# Altium schematic symbol library jlcpcb_2025_04_inductors_extended_0805.schlib: 882 symbols (part 4 of 5) (continued)
## SCHF201209H3N9ST
designator L?  Inductance: 3.9nH
Inductor, 3.9nH, 150mΩ, 600mA, SMD 0805; Manufacturer: Yanchuang; Manufacturer Part Number: SCHF201209H3N9ST; Package Size: 0805; JLCPCB Basic Part: No; JLCPCB Part Number: C578020; Supplier 1: LCSC; Category: Inductors; Supplier Part Number 1: C578020; Rated Current: 600mA; DC Resistance: 150mΩ; RoHS: Yes; ComponentLink1Description: Datasheet; ComponentLink1URL: https://wmsc.lcsc.com/wmsc/upload/file/pdf/v2/lcsc/2304140030_Yanchuang-SCHF201209H3N9ST_C578020.pdf; ComponentLink2Description: JLCPCB Part URL; ComponentLink2URL: https://jlcpcb.com/partdetail/C578020; ComponentLink3Description: LCSC Part URL; ComponentLink3URL: https://lcsc.com/product-detail/Inductors-SMD_Yanchuang-Yanchuang-SCHF201209H3N9ST_C578020.html
footprint IND-0805 (0805 (2012M) Inductor)
pins: 1, 2

## SCHF201209H4N7ST
designator L?  Inductance: 4.7nH
Inductor, 4.7nH, 200mΩ, 400mA, SMD 0805; Manufacturer: Yanchuang; Manufacturer Part Number: SCHF201209H4N7ST; Package Size: 0805; JLCPCB Basic Part: No; JLCPCB Part Number: C578021; Supplier 1: LCSC; Category: Inductors; Supplier Part Number 1: C578021; Rated Current: 400mA; DC Resistance: 200mΩ; RoHS: Yes; ComponentLink1Description: Datasheet; ComponentLink1URL: https://wmsc.lcsc.com/wmsc/upload/file/pdf/v2/lcsc/2304140030_Yanchuang-SCHF201209H4N7ST_C578021.pdf; ComponentLink2Description: JLCPCB Part URL; ComponentLink2URL: https://jlcpcb.com/partdetail/C578021; ComponentLink3Description: LCSC Part URL; ComponentLink3URL: https://lcsc.com/product-detail/Inductors-SMD_Yanchuang-Yanchuang-SCHF201209H4N7ST_C578021.html
footprint IND-0805 (0805 (2012M) Inductor)
pins: 1, 2

## SCHF201209H5N6ST
designator L?  Inductance: 5.6nH
Inductor, 5.6nH, 230mΩ, 400mA, SMD 0805; Manufacturer: Yanchuang; Manufacturer Part Number: SCHF201209H5N6ST; Package Size: 0805; JLCPCB Basic Part: No; JLCPCB Part Number: C578022; Supplier 1: LCSC; Category: Inductors; Supplier Part Number 1: C578022; Rated Current: 400mA; DC Resistance: 230mΩ; RoHS: Yes; ComponentLink1Description: Datasheet; ComponentLink1URL: https://wmsc.lcsc.com/wmsc/upload/file/pdf/v2/lcsc/2304140030_Yanchuang-SCHF201209H5N6ST_C578022.pdf; ComponentLink2Description: JLCPCB Part URL; ComponentLink2URL: https://jlcpcb.com/partdetail/C578022; ComponentLink3Description: LCSC Part URL; ComponentLink3URL: https://lcsc.com/product-detail/Inductors-SMD_Yanchuang-Yanchuang-SCHF201209H5N6ST_C578022.html
footprint IND-0805 (0805 (2012M) Inductor)
pins: 1, 2

## SCHF201209H6N8JT
designator L?  Inductance: 6.8nH
Inductor, 6.8nH, ±5%, 250mΩ, 400mA, SMD 0805; Manufacturer: Yanchuang; Manufacturer Part Number: SCHF201209H6N8JT; Package Size: 0805; JLCPCB Basic Part: No; JLCPCB Part Number: C578023; Supplier 1: LCSC; Category: Inductors; Supplier Part Number 1: C578023; Tolerance: ±5%; Rated Current: 400mA; DC Resistance: 250mΩ; RoHS: Yes; ComponentLink1Description: Datasheet; ComponentLink1URL: https://wmsc.lcsc.com/wmsc/upload/file/pdf/v2/lcsc/2304140030_Yanchuang-SCHF201209H6N8JT_C578023.pdf; ComponentLink2Description: JLCPCB Part URL; ComponentLink2URL: https://jlcpcb.com/partdetail/C578023; ComponentLink3Description: LCSC Part URL; ComponentLink3URL: https://lcsc.com/product-detail/Inductors-SMD_Yanchuang-Yanchuang-SCHF201209H6N8JT_C578023.html
footprint IND-0805 (0805 (2012M) Inductor)
pins: 1, 2

## SCHF201209H8N2JT
designator L?  Inductance: 8.2nH
Inductor, 8.2nH, ±5%, 280mΩ, 400mA, SMD 0805; Manufacturer: Yanchuang; Manufacturer Part Number: SCHF201209H8N2JT; Package Size: 0805; JLCPCB Basic Part: No; JLCPCB Part Number: C578024; Supplier 1: LCSC; Category: Inductors; Supplier Part Number 1: C578024; Tolerance: ±5%; Rated Current: 400mA; DC Resistance: 280mΩ; RoHS: Yes; ComponentLink1Description: Datasheet; ComponentLink1URL: https://wmsc.lcsc.com/wmsc/upload/file/pdf/v2/lcsc/2304140030_Yanchuang-SCHF201209H8N2JT_C578024.pdf; ComponentLink2Description: JLCPCB Part URL; ComponentLink2URL: https://jlcpcb.com/partdetail/C578024; ComponentLink3Description: LCSC Part URL; ComponentLink3URL: https://lcsc.com/product-detail/Inductors-SMD_Yanchuang-Yanchuang-SCHF201209H8N2JT_C578024.html
footprint IND-0805 (0805 (2012M) Inductor)
pins: 1, 2

## SCHF201209H18NJT
designator L?  Inductance: 18nH
Inductor, 18nH, ±5%, 450mΩ, 300mA, SMD 0805; Manufacturer: Yanchuang; Manufacturer Part Number: SCHF201209H18NJT; Package Size: 0805; JLCPCB Basic Part: No; JLCPCB Part Number: C578028; Supplier 1: LCSC; Category: Inductors; Supplier Part Number 1: C578028; Tolerance: ±5%; Rated Current: 300mA; DC Resistance: 450mΩ; RoHS: Yes; ComponentLink1Description: Datasheet; ComponentLink1URL: https://wmsc.lcsc.com/wmsc/upload/file/pdf/v2/lcsc/2304140030_Yanchuang-SCHF201209H18NJT_C578028.pdf; ComponentLink2Description: JLCPCB Part URL; ComponentLink2URL: https://jlcpcb.com/partdetail/C578028; ComponentLink3Description: LCSC Part URL; ComponentLink3URL: https://lcsc.com/product-detail/Inductors-SMD_Yanchuang-Yanchuang-SCHF201209H18NJT_C578028.html
footprint IND-0805 (0805 (2012M) Inductor)
pins: 1, 2

## SCHF201209H27NJT
designator L?  Inductance: 27nH
Inductor, 27nH, ±5%, 550mΩ, 300mA, SMD 0805; Manufacturer: Yanchuang; Manufacturer Part Number: SCHF201209H27NJT; Package Size: 0805; JLCPCB Basic Part: No; JLCPCB Part Number: C578030; Supplier 1: LCSC; Category: Inductors; Supplier Part Number 1: C578030; Tolerance: ±5%; Rated Current: 300mA; DC Resistance: 550mΩ; RoHS: Yes; ComponentLink1Description: Datasheet; ComponentLink1URL: https://wmsc.lcsc.com/wmsc/upload/file/pdf/v2/lcsc/2304140030_Yanchuang-SCHF201209H27NJT_C578030.pdf; ComponentLink2Description: JLCPCB Part URL; ComponentLink2URL: https://jlcpcb.com/partdetail/C578030; ComponentLink3Description: LCSC Part URL; ComponentLink3URL: https://lcsc.com/product-detail/Inductors-SMD_Yanchuang-Yanchuang-SCHF201209H27NJT_C578030.html
footprint IND-0805 (0805 (2012M) Inductor)
pins: 1, 2

## SCHF201209H33NJT
designator L?  Inductance: 33nH
Inductor, 33nH, ±5%, 600mΩ, 300mA, SMD 0805; Manufacturer: Yanchuang; Manufacturer Part Number: SCHF201209H33NJT; Package Size: 0805; JLCPCB Basic Part: No; JLCPCB Part Number: C578031; Supplier 1: LCSC; Category: Inductors; Supplier Part Number 1: C578031; Tolerance: ±5%; Rated Current: 300mA; DC Resistance: 600mΩ; RoHS: Yes; ComponentLink1Description: Datasheet; ComponentLink1URL: https://wmsc.lcsc.com/wmsc/upload/file/pdf/v2/lcsc/2304140030_Yanchuang-SCHF201209H33NJT_C578031.pdf; ComponentLink2Description: JLCPCB Part URL; ComponentLink2URL: https://jlcpcb.com/partdetail/C578031; ComponentLink3Description: LCSC Part URL; ComponentLink3URL: https://lcsc.com/product-detail/Inductors-SMD_Yanchuang-Yanchuang-SCHF201209H33NJT_C578031.html
footprint IND-0805 (0805 (2012M) Inductor)
pins: 1, 2

## SCHF201209H56NJT
designator L?  Inductance: 56nH
Inductor, 56nH, ±5%, 800mΩ, 300mA, SMD 0805; Manufacturer: Yanchuang; Manufacturer Part Number: SCHF201209H56NJT; Package Size: 0805; JLCPCB Basic Part: No; JLCPCB Part Number: C578034; Supplier 1: LCSC; Category: Inductors; Supplier Part Number 1: C578034; Tolerance: ±5%; Rated Current: 300mA; DC Resistance: 800mΩ; RoHS: Yes; ComponentLink1Description: Datasheet; ComponentLink1URL: https://wmsc.lcsc.com/wmsc/upload/file/pdf/v2/lcsc/2304140030_Yanchuang-SCHF201209H56NJT_C578034.pdf; ComponentLink2Description: JLCPCB Part URL; ComponentLink2URL: https://jlcpcb.com/partdetail/C578034; ComponentLink3Description: LCSC Part URL; ComponentLink3URL: https://lcsc.com/product-detail/Inductors-SMD_Yanchuang-Yanchuang-SCHF201209H56NJT_C578034.html
footprint IND-0805 (0805 (2012M) Inductor)
pins: 1, 2

## SCHF201209H68NJT
designator L?  Inductance: 68nH
Inductor, 68nH, ±5%, 850mΩ, 300mA, SMD 0805; Manufacturer: Yanchuang; Manufacturer Part Number: SCHF201209H68NJT; Package Size: 0805; JLCPCB Basic Part: No; JLCPCB Part Number: C578035; Supplier 1: LCSC; Category: Inductors; Supplier Part Number 1: C578035; Tolerance: ±5%; Rated Current: 300mA; DC Resistance: 850mΩ; RoHS: Yes; ComponentLink1Description: Datasheet; ComponentLink1URL: https://wmsc.lcsc.com/wmsc/upload/file/pdf/v2/lcsc/2304140030_Yanchuang-SCHF201209H68NJT_C578035.pdf; ComponentLink2Description: JLCPCB Part URL; ComponentLink2URL: https://jlcpcb.com/partdetail/C578035; ComponentLink3Description: LCSC Part URL; ComponentLink3URL: https://lcsc.com/product-detail/Inductors-SMD_Yanchuang-Yanchuang-SCHF201209H68NJT_C578035.html
footprint IND-0805 (0805 (2012M) Inductor)
pins: 1, 2

## SCHF201209HR12JT
designator L?  Inductance: 120nH
Inductor, 120nH, ±5%, 1.2Ω, 300mA, SMD 0805; Manufacturer: Yanchuang; Manufacturer Part Number: SCHF201209HR12JT; Package Size: 0805; JLCPCB Basic Part: No; JLCPCB Part Number: C578038; Supplier 1: LCSC; Category: Inductors; Supplier Part Number 1: C578038; Tolerance: ±5%; Rated Current: 300mA; DC Resistance: 1.2Ω; RoHS: Yes; ComponentLink1Description: Datasheet; ComponentLink1URL: https://wmsc.lcsc.com/wmsc/upload/file/pdf/v2/lcsc/2304140030_Yanchuang-SCHF201209HR12JT_C578038.pdf; ComponentLink2Description: JLCPCB Part URL; ComponentLink2URL: https://jlcpcb.com/partdetail/C578038; ComponentLink3Description: LCSC Part URL; ComponentLink3URL: https://lcsc.com/product-detail/Inductors-SMD_Yanchuang-Yanchuang-SCHF201209HR12JT_C578038.html
footprint IND-0805 (0805 (2012M) Inductor)
pins: 1, 2

## SCL2012LR47KSP
designator L?  Inductance: 470nH
Inductor, 470nH, ±10%, 200mΩ, 300mA, SMD 0805; Manufacturer: Sunltech Tech; Manufacturer Part Number: SCL2012LR47KSP; Package Size: 0805; JLCPCB Basic Part: No; JLCPCB Part Number: C412002; Supplier 1: LCSC; Category: Inductors; Supplier Part Number 1: C412002; Tolerance: ±10%; Rated Current: 300mA; DC Resistance: 200mΩ; RoHS: Yes; ComponentLink1Description: Datasheet; ComponentLink1URL: https://wmsc.lcsc.com/wmsc/upload/file/pdf/v2/lcsc/2304140030_Sunltech-Tech-SCL2012LR47KSP_C412002.pdf; ComponentLink2Description: JLCPCB Part URL; ComponentLink2URL: https://jlcpcb.com/partdetail/C412002; ComponentLink3Description: LCSC Part URL; ComponentLink3URL: https://lcsc.com/product-detail/Inductors-SMD_Sunltech-Tech-Sunltech-Tech-SCL2012LR47KSP_C412002.html
footprint IND-0805 (0805 (2012M) Inductor)
pins: 1, 2

## SCL2012LR68KSP
designator L?  Inductance: 680nH
Inductor, 680nH, ±10%, 800mΩ, 150mA, SMD 0805; Manufacturer: Sunltech Tech; Manufacturer Part Number: SCL2012LR68KSP; Package Size: 0805; JLCPCB Basic Part: No; JLCPCB Part Number: C412003; Supplier 1: LCSC; Category: Inductors; Supplier Part Number 1: C412003; Tolerance: ±10%; Rated Current: 150mA; DC Resistance: 800mΩ; RoHS: Yes; ComponentLink1Description: Datasheet; ComponentLink1URL: https://wmsc.lcsc.com/wmsc/upload/file/pdf/v2/lcsc/2304140030_Sunltech-Tech-SCL2012LR68KSP_C412003.pdf; ComponentLink2Description: JLCPCB Part URL; ComponentLink2URL: https://jlcpcb.com/partdetail/C412003; ComponentLink3Description: LCSC Part URL; ComponentLink3URL: https://lcsc.com/product-detail/Inductors-SMD_Sunltech-Tech-Sunltech-Tech-SCL2012LR68KSP_C412003.html
footprint IND-0805 (0805 (2012M) Inductor)
pins: 1, 2

## SCL2012P1R0KSP
designator L?  Inductance: 1uH
Inductor, 1uH, ±10%, 400mΩ, 50mA, SMD 0805; Manufacturer: Sunltech Tech; Manufacturer Part Number: SCL2012P1R0KSP; Package Size: 0805; JLCPCB Basic Part: No; JLCPCB Part Number: C412004; Supplier 1: LCSC; Category: Inductors; Supplier Part Number 1: C412004; Tolerance: ±10%; Rated Current: 50mA; DC Resistance: 400mΩ; RoHS: Yes; ComponentLink1Description: Datasheet; ComponentLink1URL: https://wmsc.lcsc.com/wmsc/upload/file/pdf/v2/lcsc/2304140030_Sunltech-Tech-SCL2012P1R0KSP_C412004.pdf; ComponentLink2Description: JLCPCB Part URL; ComponentLink2URL: https://jlcpcb.com/partdetail/C412004; ComponentLink3Description: LCSC Part URL; ComponentLink3URL: https://lcsc.com/product-detail/Inductors-SMD_Sunltech-Tech-Sunltech-Tech-SCL2012P1R0KSP_C412004.html
footprint IND-0805 (0805 (2012M) Inductor)
pins: 1, 2

## SCL2012P2R2KSP
designator L?  Inductance: 2.2uH
Inductor, 2.2uH, ±10%, 650mΩ, 30mA, SMD 0805; Manufacturer: Sunltech Tech; Manufacturer Part Number: SCL2012P2R2KSP; Package Size: 0805; JLCPCB Basic Part: No; JLCPCB Part Number: C412005; Supplier 1: LCSC; Category: Inductors; Supplier Part Number 1: C412005; Tolerance: ±10%; Rated Current: 30mA; DC Resistance: 650mΩ; RoHS: Yes; ComponentLink1Description: Datasheet; ComponentLink1URL: https://wmsc.lcsc.com/wmsc/upload/file/pdf/v2/lcsc/2304140030_Sunltech-Tech-SCL2012P2R2KSP_C412005.pdf; ComponentLink2Description: JLCPCB Part URL; ComponentLink2URL: https://jlcpcb.com/partdetail/C412005; ComponentLink3Description: LCSC Part URL; ComponentLink3URL: https://lcsc.com/product-detail/Inductors-SMD_Sunltech-Tech-Sunltech-Tech-SCL2012P2R2KSP_C412005.html
footprint IND-0805 (0805 (2012M) Inductor)
pins: 1, 2

## SCL2012Q3R3KSP
designator L?  Inductance: 3.3uH
Inductor, 3.3uH, ±10%, 800mΩ, 30mA, SMD 0805; Manufacturer: Sunltech Tech; Manufacturer Part Number: SCL2012Q3R3KSP; Package Size: 0805; JLCPCB Basic Part: No; JLCPCB Part Number: C412006; Supplier 1: LCSC; Category: Inductors; Supplier Part Number 1: C412006; Tolerance: ±10%; Rated Current: 30mA; DC Resistance: 800mΩ; RoHS: Yes; ComponentLink1Description: Datasheet; ComponentLink1URL: https://wmsc.lcsc.com/wmsc/upload/file/pdf/v2/lcsc/2304140030_Sunltech-Tech-SCL2012Q3R3KSP_C412006.pdf; ComponentLink2Description: JLCPCB Part URL; ComponentLink2URL: https://jlcpcb.com/partdetail/C412006; ComponentLink3Description: LCSC Part URL; ComponentLink3URL: https://lcsc.com/product-detail/Inductors-SMD_Sunltech-Tech-Sunltech-Tech-SCL2012Q3R3KSP_C412006.html
footprint IND-0805 (0805 (2012M) Inductor)
pins: 1, 2

## SCL2012Q4R7KSP
designator L?  Inductance: 4.7uH
Inductor, 4.7uH, ±10%, 1Ω, 30mA, SMD 0805; Manufacturer: Sunltech Tech; Manufacturer Part Number: SCL2012Q4R7KSP; Package Size: 0805; JLCPCB Basic Part: No; JLCPCB Part Number: C412007; Supplier 1: LCSC; Category: Inductors; Supplier Part Number 1: C412007; Tolerance: ±10%; Rated Current: 30mA; DC Resistance: 1Ω; RoHS: Yes; ComponentLink1Description: Datasheet; ComponentLink1URL: https://wmsc.lcsc.com/wmsc/upload/file/pdf/v2/lcsc/2304140030_Sunltech-Tech-SCL2012Q4R7KSP_C412007.pdf; ComponentLink2Description: JLCPCB Part URL; ComponentLink2URL: https://jlcpcb.com/partdetail/C412007; ComponentLink3Description: LCSC Part URL; ComponentLink3URL: https://lcsc.com/product-detail/Inductors-SMD_Sunltech-Tech-Sunltech-Tech-SCL2012Q4R7KSP_C412007.html
footprint IND-0805 (0805 (2012M) Inductor)
pins: 1, 2

## SCL2012T220KSP
designator L?  Inductance: 22uH
Inductor, 22uH, ±10%, 1.1Ω, 5mA, SMD 0805; Manufacturer: Sunltech Tech; Manufacturer Part Number: SCL2012T220KSP; Package Size: 0805; JLCPCB Basic Part: No; JLCPCB Part Number: C412009; Supplier 1: LCSC; Category: Inductors; Supplier Part Number 1: C412009; Tolerance: ±10%; Rated Current: 5mA; DC Resistance: 1.1Ω; RoHS: Yes; ComponentLink1Description: Datasheet; ComponentLink1URL: https://wmsc.lcsc.com/wmsc/upload/file/pdf/v2/lcsc/2304140030_Sunltech-Tech-SCL2012T220KSP_C412009.pdf; ComponentLink2Description: JLCPCB Part URL; ComponentLink2URL: https://jlcpcb.com/partdetail/C412009; ComponentLink3Description: LCSC Part URL; ComponentLink3URL: https://lcsc.com/product-detail/Inductors-SMD_Sunltech-Tech-Sunltech-Tech-SCL2012T220KSP_C412009.html
footprint IND-0805 (0805 (2012M) Inductor)
pins: 1, 2

## SCL2012T470KSP
designator L?  Inductance: 47uH
Inductor, 47uH, ±10%, 3Ω, 4mA, SMD 0805; Manufacturer: Sunltech Tech; Manufacturer Part Number: SCL2012T470KSP; Package Size: 0805; JLCPCB Basic Part: No; JLCPCB Part Number: C412011; Supplier 1: LCSC; Category: Inductors; Supplier Part Number 1: C412011; Tolerance: ±10%; Rated Current: 4mA; DC Resistance: 3Ω; RoHS: Yes; ComponentLink1Description: Datasheet; ComponentLink1URL: https://wmsc.lcsc.com/wmsc/upload/file/pdf/v2/lcsc/2304140030_Sunltech-Tech-SCL2012T470KSP_C412011.pdf; ComponentLink2Description: JLCPCB Part URL; ComponentLink2URL: https://jlcpcb.com/partdetail/C412011; ComponentLink3Description: LCSC Part URL; ComponentLink3URL: https://lcsc.com/product-detail/Inductors-SMD_Sunltech-Tech-Sunltech-Tech-SCL2012T470KSP_C412011.html
footprint IND-0805 (0805 (2012M) Inductor)
pins: 1, 2

## SCMI201209U1R5KT
designator L?  Inductance: 1.5uH
Inductor, 1.5uH, ±10%, 400mΩ, 50mA, SMD 0805; Manufacturer: Yanchuang; Manufacturer Part Number: SCMI201209U1R5KT; Package Size: 0805; JLCPCB Basic Part: No; JLCPCB Part Number: C479896; Supplier 1: LCSC; Category: Inductors; Supplier Part Number 1: C479896; Tolerance: ±10%; Rated Current: 50mA; DC Resistance: 400mΩ; RoHS: Yes; ComponentLink1Description: Datasheet; ComponentLink1URL: https://wmsc.lcsc.com/wmsc/upload/file/pdf/v2/lcsc/2007222003_Yanchuang-SCMI201209U1R5KT_C479896.pdf; ComponentLink2Description: JLCPCB Part URL; ComponentLink2URL: https://jlcpcb.com/partdetail/C479896; ComponentLink3Description: LCSC Part URL; ComponentLink3URL: https://lcsc.com/product-detail/Inductors-SMD_Yanchuang-Yanchuang-SCMI201209U1R5KT_C479896.html
footprint IND-0805 (0805 (2012M) Inductor)
pins: 1, 2

## SCMI201209U1R8KT
designator L?  Inductance: 1.8uH
Inductor, 1.8uH, ±10%, 400mΩ, 50mA, SMD 0805; Manufacturer: Yanchuang; Manufacturer Part Number: SCMI201209U1R8KT; Package Size: 0805; JLCPCB Basic Part: No; JLCPCB Part Number: C479897; Supplier 1: LCSC; Category: Inductors; Supplier Part Number 1: C479897; Tolerance: ±10%; Rated Current: 50mA; DC Resistance: 400mΩ; RoHS: Yes; ComponentLink1Description: Datasheet; ComponentLink1URL: https://wmsc.lcsc.com/wmsc/upload/file/pdf/v2/lcsc/2007222003_Yanchuang-SCMI201209U1R8KT_C479897.pdf; ComponentLink2Description: JLCPCB Part URL; ComponentLink2URL: https://jlcpcb.com/partdetail/C479897; ComponentLink3Description: LCSC Part URL; ComponentLink3URL: https://lcsc.com/product-detail/Inductors-SMD_Yanchuang-Yanchuang-SCMI201209U1R8KT_C479897.html
footprint IND-0805 (0805 (2012M) Inductor)
pins: 1, 2

## SCMI201209U2R2KT
designator L?  Inductance: 2.2uH
Inductor, 2.2uH, ±10%, 600mΩ, 50mA, SMD 0805; Manufacturer: Yanchuang; Manufacturer Part Number: SCMI201209U2R2KT; Package Size: 0805; JLCPCB Basic Part: No; JLCPCB Part Number: C479898; Supplier 1: LCSC; Category: Inductors; Supplier Part Number 1: C479898; Tolerance: ±10%; Rated Current: 50mA; DC Resistance: 600mΩ; RoHS: Yes; ComponentLink1Description: Datasheet; ComponentLink1URL: https://wmsc.lcsc.com/wmsc/upload/file/pdf/v2/lcsc/2007222003_Yanchuang-SCMI201209U2R2KT_C479898.pdf; ComponentLink2Description: JLCPCB Part URL; ComponentLink2URL: https://jlcpcb.com/partdetail/C479898; ComponentLink3Description: LCSC Part URL; ComponentLink3URL: https://lcsc.com/product-detail/Inductors-SMD_Yanchuang-Yanchuang-SCMI201209U2R2KT_C479898.html
footprint IND-0805 (0805 (2012M) Inductor)
pins: 1, 2

## SCMI201209U3R9KT
designator L?  Inductance: 3.9uH
Inductor, 3.9uH, ±10%, 800mΩ, 50mA, SMD 0805; Manufacturer: Yanchuang; Manufacturer Part Number: SCMI201209U3R9KT; Package Size: 0805; JLCPCB Basic Part: No; JLCPCB Part Number: C479901; Supplier 1: LCSC; Category: Inductors; Supplier Part Number 1: C479901; Tolerance: ±10%; Rated Current: 50mA; DC Resistance: 800mΩ; RoHS: Yes; ComponentLink1Description: Datasheet; ComponentLink1URL: https://wmsc.lcsc.com/wmsc/upload/file/pdf/v2/lcsc/2007222003_Yanchuang-SCMI201209U3R9KT_C479901.pdf; ComponentLink2Description: JLCPCB Part URL; ComponentLink2URL: https://jlcpcb.com/partdetail/C479901; ComponentLink3Description: LCSC Part URL; ComponentLink3URL: https://lcsc.com/product-detail/Inductors-SMD_Yanchuang-Yanchuang-SCMI201209U3R9KT_C479901.html
footprint IND-0805 (0805 (2012M) Inductor)
pins: 1, 2

## SCMI201209X8R2KT
designator L?  Inductance: 8.2uH
Inductor, 8.2uH, ±10%, 1.05Ω, 15mA, SMD 0805; Manufacturer: Yanchuang; Manufacturer Part Number: SCMI201209X8R2KT; Package Size: 0805; JLCPCB Basic Part: No; JLCPCB Part Number: C479905; Supplier 1: LCSC; Category: Inductors; Supplier Part Number 1: C479905; Tolerance: ±10%; Rated Current: 15mA; DC Resistance: 1.05Ω; RoHS: Yes; ComponentLink1Description: Datasheet; ComponentLink1URL: https://wmsc.lcsc.com/wmsc/upload/file/pdf/v2/lcsc/2007222003_Yanchuang-SCMI201209X8R2KT_C479905.pdf; ComponentLink2Description: JLCPCB Part URL; ComponentLink2URL: https://jlcpcb.com/partdetail/C479905; ComponentLink3Description: LCSC Part URL; ComponentLink3URL: https://lcsc.com/product-detail/Inductors-SMD_Yanchuang-Yanchuang-SCMI201209X8R2KT_C479905.html
footprint IND-0805 (0805 (2012M) Inductor)
pins: 1, 2

## SCMI201209X100KT
designator L?  Inductance: 10uH
Inductor, 10uH, ±10%, 1.15Ω, 15mA, SMD 0805; Manufacturer: Yanchuang; Manufacturer Part Number: SCMI201209X100KT; Package Size: 0805; JLCPCB Basic Part: No; JLCPCB Part Number: C479906; Supplier 1: LCSC; Category: Inductors; Supplier Part Number 1: C479906; Tolerance: ±10%; Rated Current: 15mA; DC Resistance: 1.15Ω; RoHS: Yes; ComponentLink1Description: Datasheet; ComponentLink1URL: https://wmsc.lcsc.com/wmsc/upload/file/pdf/v2/lcsc/2007222003_Yanchuang-SCMI201209X100KT_C479906.pdf; ComponentLink2Description: JLCPCB Part URL; ComponentLink2URL: https://jlcpcb.com/partdetail/C479906; ComponentLink3Description: LCSC Part URL; ComponentLink3URL: https://lcsc.com/product-detail/Inductors-SMD_Yanchuang-Yanchuang-SCMI201209X100KT_C479906.html
footprint IND-0805 (0805 (2012M) Inductor)
pins: 1, 2

## SCW2012CR18JST
designator L?  Inductance: 180nH
Inductor, 180nH, ±5%, 640mΩ, 400mA, SMD 0805; Manufacturer: Sunltech Tech; Manufacturer Part Number: SCW2012CR18JST; Package Size: 0805; JLCPCB Basic Part: No; JLCPCB Part Number: C330902; Supplier 1: LCSC; Category: Inductors; Supplier Part Number 1: C330902; Tolerance: ±5%; Rated Current: 400mA; DC Resistance: 640mΩ; RoHS: Yes; ComponentLink1Description: Datasheet; ComponentLink1URL: https://wmsc.lcsc.com/wmsc/upload/file/pdf/v2/lcsc/2304140030_Sunltech-Tech-SCW2012CR18JST_C330902.pdf; ComponentLink2Description: JLCPCB Part URL; ComponentLink2URL: https://jlcpcb.com/partdetail/C330902; ComponentLink3Description: LCSC Part URL; ComponentLink3URL: https://lcsc.com/product-detail/Inductors-SMD_Sunltech-Tech-Sunltech-Tech-SCW2012CR18JST_C330902.html
footprint IND-0805 (0805 (2012M) Inductor)
pins: 1, 2

## SCW2012F1R0KST
designator L?  Inductance: 1uH
Inductor, 1uH, ±10%, 1Ω, 430mA, SMD 0805; Manufacturer: Sunltech Tech; Manufacturer Part Number: SCW2012F1R0KST; Package Size: 0805; JLCPCB Basic Part: No; JLCPCB Part Number: C363972; Supplier 1: LCSC; Category: Inductors; Supplier Part Number 1: C363972; Tolerance: ±10%; Rated Current: 430mA; DC Resistance: 1Ω; RoHS: Yes; ComponentLink1Description: Datasheet; ComponentLink1URL: https://wmsc.lcsc.com/wmsc/upload/file/pdf/v2/lcsc/2304140030_Sunltech-Tech-SCW2012F1R0KST_C363972.pdf; ComponentLink2Description: JLCPCB Part URL; ComponentLink2URL: https://jlcpcb.com/partdetail/C363972; ComponentLink3Description: LCSC Part URL; ComponentLink3URL: https://lcsc.com/product-detail/Inductors-SMD_Sunltech-Tech-Sunltech-Tech-SCW2012F1R0KST_C363972.html
footprint IND-0805 (0805 (2012M) Inductor)
pins: 1, 2

## SCW2012F1R2KST
designator L?  Inductance: 1.2uH
Inductor, 1.2uH, ±10%, 1.15Ω, 410mA, SMD 0805; Manufacturer: Sunltech Tech; Manufacturer Part Number: SCW2012F1R2KST; Package Size: 0805; JLCPCB Basic Part: No; JLCPCB Part Number: C363973; Supplier 1: LCSC; Category: Inductors; Supplier Part Number 1: C363973; Tolerance: ±10%; Rated Current: 410mA; DC Resistance: 1.15Ω; RoHS: Yes; ComponentLink1Description: Datasheet; ComponentLink1URL: https://wmsc.lcsc.com/wmsc/upload/file/pdf/v2/lcsc/2304140030_Sunltech-Tech-SCW2012F1R2KST_C363973.pdf; ComponentLink2Description: JLCPCB Part URL; ComponentLink2URL: https://jlcpcb.com/partdetail/C363973; ComponentLink3Description: LCSC Part URL; ComponentLink3URL: https://lcsc.com/product-detail/Inductors-SMD_Sunltech-Tech-Sunltech-Tech-SCW2012F1R2KST_C363973.html
footprint IND-0805 (0805 (2012M) Inductor)
pins: 1, 2

## SCW2012F1R5KST
designator L?  Inductance: 1.5uH
Inductor, 1.5uH, ±10%, 830mΩ, 700mA, SMD 0805; Manufacturer: Sunltech Tech; Manufacturer Part Number: SCW2012F1R5KST; Package Size: 0805; JLCPCB Basic Part: No; JLCPCB Part Number: C363974; Supplier 1: LCSC; Category: Inductors; Supplier Part Number 1: C363974; Tolerance: ±10%; Rated Current: 700mA; DC Resistance: 830mΩ; RoHS: Yes; ComponentLink1Description: Datasheet; ComponentLink1URL: https://wmsc.lcsc.com/wmsc/upload/file/pdf/v2/lcsc/2304140030_Sunltech-Tech-SCW2012F1R5KST_C363974.pdf; ComponentLink2Description: JLCPCB Part URL; ComponentLink2URL: https://jlcpcb.com/partdetail/C363974; ComponentLink3Description: LCSC Part URL; ComponentLink3URL: https://lcsc.com/product-detail/Inductors-SMD_Sunltech-Tech-Sunltech-Tech-SCW2012F1R5KST_C363974.html
footprint IND-0805 (0805 (2012M) Inductor)
pins: 1, 2

## SCW2012F1R8KST
designator L?  Inductance: 1.8uH
Inductor, 1.8uH, ±10%, SMD 0805; Manufacturer: Sunltech Tech; Manufacturer Part Number: SCW2012F1R8KST; Package Size: 0805; JLCPCB Basic Part: No; JLCPCB Part Number: C364075; Supplier 1: LCSC; Category: Inductors; Supplier Part Number 1: C364075; Tolerance: ±10%; RoHS: Yes; ComponentLink1Description: Datasheet; ComponentLink1URL: https://wmsc.lcsc.com/wmsc/upload/file/pdf/v2/lcsc/2304140030_Sunltech-Tech-SCW2012F1R8KST_C364075.pdf; ComponentLink2Description: JLCPCB Part URL; ComponentLink2URL: https://jlcpcb.com/partdetail/C364075; ComponentLink3Description: LCSC Part URL; ComponentLink3URL: https://lcsc.com/product-detail/Inductors-SMD_Sunltech-Tech-Sunltech-Tech-SCW2012F1R8KST_C364075.html
footprint IND-0805 (0805 (2012M) Inductor)
pins: 1, 2

## SCW2012F3R3KST
designator L?  Inductance: 3.3uH
Inductor, 3.3uH, ±10%, 1.8Ω, 300mA, SMD 0805; Manufacturer: Sunltech Tech; Manufacturer Part Number: SCW2012F3R3KST; Package Size: 0805; JLCPCB Basic Part: No; JLCPCB Part Number: C364077; Supplier 1: LCSC; Category: Inductors; Supplier Part Number 1: C364077; Tolerance: ±10%; Rated Current: 300mA; DC Resistance: 1.8Ω; RoHS: Yes; ComponentLink1Description: Datasheet; ComponentLink1URL: https://wmsc.lcsc.com/wmsc/upload/file/pdf/v2/lcsc/2304140030_Sunltech-Tech-SCW2012F3R3KST_C364077.pdf; ComponentLink2Description: JLCPCB Part URL; ComponentLink2URL: https://jlcpcb.com/partdetail/C364077; ComponentLink3Description: LCSC Part URL; ComponentLink3URL: https://lcsc.com/product-detail/Inductors-SMD_Sunltech-Tech-Sunltech-Tech-SCW2012F3R3KST_C364077.html
footprint IND-0805 (0805 (2012M) Inductor)
pins: 1, 2

## SCW2012F4R7KST
designator L?  Inductance: 4.7uH
Inductor, 4.7uH, ±10%, 2.05Ω, 250mA, SMD 0805; Manufacturer: Sunltech Tech; Manufacturer Part Number: SCW2012F4R7KST; Package Size: 0805; JLCPCB Basic Part: No; JLCPCB Part Number: C364078; Supplier 1: LCSC; Category: Inductors; Supplier Part Number 1: C364078; Tolerance: ±10%; Rated Current: 250mA; DC Resistance: 2.05Ω; RoHS: Yes; ComponentLink1Description: Datasheet; ComponentLink1URL: https://wmsc.lcsc.com/wmsc/upload/file/pdf/v2/lcsc/2304140030_Sunltech-Tech-SCW2012F4R7KST_C364078.pdf; ComponentLink2Description: JLCPCB Part URL; ComponentLink2URL: https://jlcpcb.com/partdetail/C364078; ComponentLink3Description: LCSC Part URL; ComponentLink3URL: https://lcsc.com/product-detail/Inductors-SMD_Sunltech-Tech-Sunltech-Tech-SCW2012F4R7KST_C364078.html
footprint IND-0805 (0805 (2012M) Inductor)
pins: 1, 2

## SCW2012F6R8KST
designator L?  Inductance: 6.8uH
Inductor, 6.8uH, ±10%, 2.6Ω, 220mA, SMD 0805; Manufacturer: Sunltech Tech; Manufacturer Part Number: SCW2012F6R8KST; Package Size: 0805; JLCPCB Basic Part: No; JLCPCB Part Number: C364079; Supplier 1: LCSC; Category: Inductors; Supplier Part Number 1: C364079; Tolerance: ±10%; Rated Current: 220mA; DC Resistance: 2.6Ω; RoHS: Yes; ComponentLink1Description: Datasheet; ComponentLink1URL: https://wmsc.lcsc.com/wmsc/upload/file/pdf/v2/lcsc/2304140030_Sunltech-Tech-SCW2012F6R8KST_C364079.pdf; ComponentLink2Description: JLCPCB Part URL; ComponentLink2URL: https://jlcpcb.com/partdetail/C364079; ComponentLink3Description: LCSC Part URL; ComponentLink3URL: https://lcsc.com/product-detail/Inductors-SMD_Sunltech-Tech-Sunltech-Tech-SCW2012F6R8KST_C364079.html
footprint IND-0805 (0805 (2012M) Inductor)
pins: 1, 2

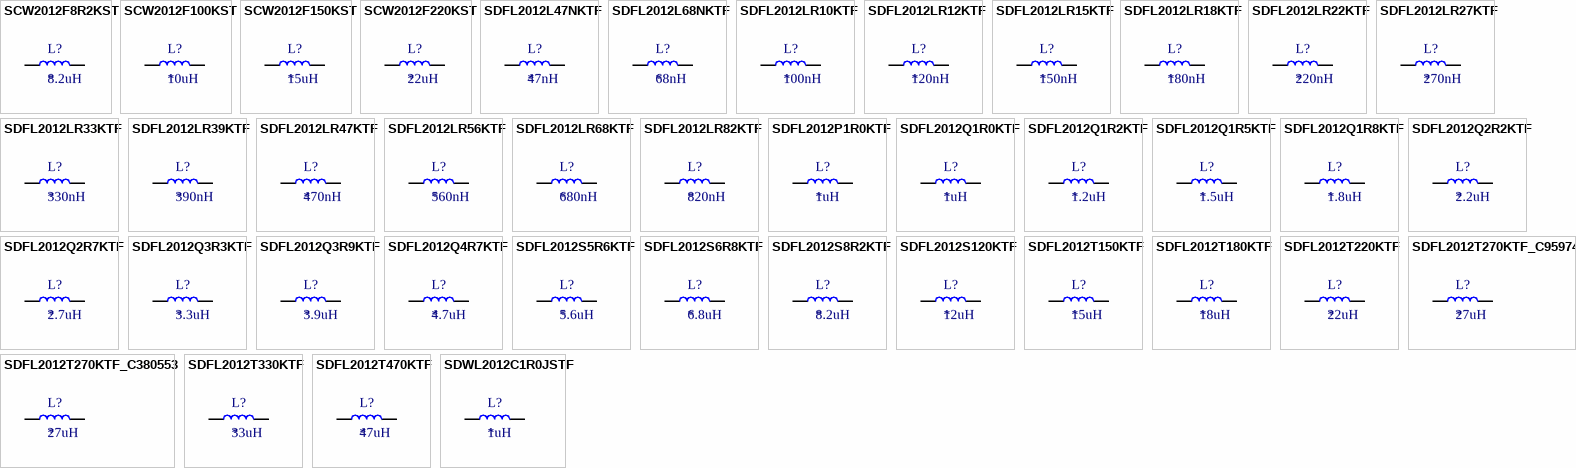
[diagram p19: symbols SCW2012F8R2KST to SDWL2012C1R0JSTF]

## SCW2012F8R2KST
designator L?  Inductance: 8.2uH
Inductor, 8.2uH, ±10%, 3Ω, 180mA, SMD 0805; Manufacturer: Sunltech Tech; Manufacturer Part Number: SCW2012F8R2KST; Package Size: 0805; JLCPCB Basic Part: No; JLCPCB Part Number: C364080; Supplier 1: LCSC; Category: Inductors; Supplier Part Number 1: C364080; Tolerance: ±10%; Rated Current: 180mA; DC Resistance: 3Ω; RoHS: Yes; ComponentLink1Description: Datasheet; ComponentLink1URL: https://wmsc.lcsc.com/wmsc/upload/file/pdf/v2/lcsc/2304140030_Sunltech-Tech-SCW2012F8R2KST_C364080.pdf; ComponentLink2Description: JLCPCB Part URL; ComponentLink2URL: https://jlcpcb.com/partdetail/C364080; ComponentLink3Description: LCSC Part URL; ComponentLink3URL: https://lcsc.com/product-detail/Inductors-SMD_Sunltech-Tech-Sunltech-Tech-SCW2012F8R2KST_C364080.html
footprint IND-0805 (0805 (2012M) Inductor)
pins: 1, 2

## SCW2012F100KST
designator L?  Inductance: 10uH
Inductor, 10uH, ±10%, 3.2Ω, 150mA, SMD 0805; Manufacturer: Sunltech Tech; Manufacturer Part Number: SCW2012F100KST; Package Size: 0805; JLCPCB Basic Part: No; JLCPCB Part Number: C364081; Supplier 1: LCSC; Category: Inductors; Supplier Part Number 1: C364081; Tolerance: ±10%; Rated Current: 150mA; DC Resistance: 3.2Ω; RoHS: Yes; ComponentLink1Description: Datasheet; ComponentLink1URL: https://wmsc.lcsc.com/wmsc/upload/file/pdf/v2/lcsc/2304140030_Sunltech-Tech-SCW2012F100KST_C364081.pdf; ComponentLink2Description: JLCPCB Part URL; ComponentLink2URL: https://jlcpcb.com/partdetail/C364081; ComponentLink3Description: LCSC Part URL; ComponentLink3URL: https://lcsc.com/product-detail/Inductors-SMD_Sunltech-Tech-Sunltech-Tech-SCW2012F100KST_C364081.html
footprint IND-0805 (0805 (2012M) Inductor)
pins: 1, 2

## SCW2012F150KST
designator L?  Inductance: 15uH
Inductor, 15uH, ±10%, 4.2Ω, 100mA, SMD 0805; Manufacturer: Sunltech Tech; Manufacturer Part Number: SCW2012F150KST; Package Size: 0805; JLCPCB Basic Part: No; JLCPCB Part Number: C364082; Supplier 1: LCSC; Category: Inductors; Supplier Part Number 1: C364082; Tolerance: ±10%; Rated Current: 100mA; DC Resistance: 4.2Ω; RoHS: Yes; ComponentLink1Description: Datasheet; ComponentLink1URL: https://wmsc.lcsc.com/wmsc/upload/file/pdf/v2/lcsc/2304140030_Sunltech-Tech-SCW2012F150KST_C364082.pdf; ComponentLink2Description: JLCPCB Part URL; ComponentLink2URL: https://jlcpcb.com/partdetail/C364082; ComponentLink3Description: LCSC Part URL; ComponentLink3URL: https://lcsc.com/product-detail/Inductors-SMD_Sunltech-Tech-Sunltech-Tech-SCW2012F150KST_C364082.html
footprint IND-0805 (0805 (2012M) Inductor)
pins: 1, 2

## SCW2012F220KST
designator L?  Inductance: 22uH
Inductor, 22uH, ±10%, 6Ω, 80mA, SMD 0805; Manufacturer: Sunltech Tech; Manufacturer Part Number: SCW2012F220KST; Package Size: 0805; JLCPCB Basic Part: No; JLCPCB Part Number: C364083; Supplier 1: LCSC; Category: Inductors; Supplier Part Number 1: C364083; Tolerance: ±10%; Rated Current: 80mA; DC Resistance: 6Ω; RoHS: Yes; ComponentLink1Description: Datasheet; ComponentLink1URL: https://wmsc.lcsc.com/wmsc/upload/file/pdf/v2/lcsc/1912111437_Sunltech-Tech-SCW2012F220KST_C364083.pdf; ComponentLink2Description: JLCPCB Part URL; ComponentLink2URL: https://jlcpcb.com/partdetail/C364083; ComponentLink3Description: LCSC Part URL; ComponentLink3URL: https://lcsc.com/product-detail/Inductors-SMD_Sunltech-Tech-Sunltech-Tech-SCW2012F220KST_C364083.html
footprint IND-0805 (0805 (2012M) Inductor)
pins: 1, 2

## SDFL2012L47NKTF
designator L?  Inductance: 47nH
Inductor, 47nH, ±10%, 200mΩ, 300mA, SMD 0805; Manufacturer: Sunlord; Manufacturer Part Number: SDFL2012L47NKTF; Package Size: 0805; JLCPCB Basic Part: No; JLCPCB Part Number: C370267; Supplier 1: LCSC; Category: Inductors; Supplier Part Number 1: C370267; Tolerance: ±10%; Rated Current: 300mA; DC Resistance: 200mΩ; RoHS: Yes; ComponentLink1Description: Datasheet; ComponentLink1URL: https://wmsc.lcsc.com/wmsc/upload/file/pdf/v2/lcsc/2310301641_Sunlord-SDFL2012L47NKTF_C370267.pdf; ComponentLink2Description: JLCPCB Part URL; ComponentLink2URL: https://jlcpcb.com/partdetail/C370267; ComponentLink3Description: LCSC Part URL; ComponentLink3URL: https://lcsc.com/product-detail/Inductors-SMD_Sunlord-Sunlord-SDFL2012L47NKTF_C370267.html
footprint IND-0805 (0805 (2012M) Inductor)
pins: 1, 2

## SDFL2012L68NKTF
designator L?  Inductance: 68nH
Inductor, 68nH, ±10%, 200mΩ, 300mA, SMD 0805; Manufacturer: Sunlord; Manufacturer Part Number: SDFL2012L68NKTF; Package Size: 0805; JLCPCB Basic Part: No; JLCPCB Part Number: C370268; Supplier 1: LCSC; Category: Inductors; Supplier Part Number 1: C370268; Tolerance: ±10%; Rated Current: 300mA; DC Resistance: 200mΩ; RoHS: Yes; ComponentLink1Description: Datasheet; ComponentLink1URL: https://wmsc.lcsc.com/wmsc/upload/file/pdf/v2/lcsc/2310301641_Sunlord-SDFL2012L68NKTF_C370268.pdf; ComponentLink2Description: JLCPCB Part URL; ComponentLink2URL: https://jlcpcb.com/partdetail/C370268; ComponentLink3Description: LCSC Part URL; ComponentLink3URL: https://lcsc.com/product-detail/Inductors-SMD_Sunlord-Sunlord-SDFL2012L68NKTF_C370268.html
footprint IND-0805 (0805 (2012M) Inductor)
pins: 1, 2

## SDFL2012LR10KTF
designator L?  Inductance: 100nH
Inductor, 100nH, ±10%, 300mΩ, 250mA, SMD 0805; Manufacturer: Sunlord; Manufacturer Part Number: SDFL2012LR10KTF; Package Size: 0805; JLCPCB Basic Part: No; JLCPCB Part Number: C74321; Supplier 1: LCSC; Category: Inductors; Supplier Part Number 1: C74321; Tolerance: ±10%; Rated Current: 250mA; DC Resistance: 300mΩ; RoHS: Yes; ComponentLink1Description: Datasheet; ComponentLink1URL: https://wmsc.lcsc.com/wmsc/upload/file/pdf/v2/lcsc/2310301641_Sunlord-SDFL2012LR10KTF_C74321.pdf; ComponentLink2Description: JLCPCB Part URL; ComponentLink2URL: https://jlcpcb.com/partdetail/C74321; ComponentLink3Description: LCSC Part URL; ComponentLink3URL: https://lcsc.com/product-detail/Inductors-SMD_Sunlord-Sunlord-SDFL2012LR10KTF_C74321.html
footprint IND-0805 (0805 (2012M) Inductor)
pins: 1, 2

## SDFL2012LR12KTF
designator L?  Inductance: 120nH
Inductor, 120nH, ±10%, 300mΩ, 250mA, SMD 0805; Manufacturer: Sunlord; Manufacturer Part Number: SDFL2012LR12KTF; Package Size: 0805; JLCPCB Basic Part: No; JLCPCB Part Number: C370269; Supplier 1: LCSC; Category: Inductors; Supplier Part Number 1: C370269; Tolerance: ±10%; Rated Current: 250mA; DC Resistance: 300mΩ; RoHS: Yes; ComponentLink1Description: Datasheet; ComponentLink1URL: https://wmsc.lcsc.com/wmsc/upload/file/pdf/v2/lcsc/2310301641_Sunlord-SDFL2012LR12KTF_C370269.pdf; ComponentLink2Description: JLCPCB Part URL; ComponentLink2URL: https://jlcpcb.com/partdetail/C370269; ComponentLink3Description: LCSC Part URL; ComponentLink3URL: https://lcsc.com/product-detail/Inductors-SMD_Sunlord-Sunlord-SDFL2012LR12KTF_C370269.html
footprint IND-0805 (0805 (2012M) Inductor)
pins: 1, 2

## SDFL2012LR15KTF
designator L?  Inductance: 150nH
Inductor, 150nH, ±10%, 400mΩ, 250mA, SMD 0805; Manufacturer: Sunlord; Manufacturer Part Number: SDFL2012LR15KTF; Package Size: 0805; JLCPCB Basic Part: No; JLCPCB Part Number: C74320; Supplier 1: LCSC; Category: Inductors; Supplier Part Number 1: C74320; Tolerance: ±10%; Rated Current: 250mA; DC Resistance: 400mΩ; RoHS: Yes; ComponentLink1Description: Datasheet; ComponentLink1URL: https://wmsc.lcsc.com/wmsc/upload/file/pdf/v2/lcsc/2310301641_Sunlord-SDFL2012LR15KTF_C74320.pdf; ComponentLink2Description: JLCPCB Part URL; ComponentLink2URL: https://jlcpcb.com/partdetail/C74320; ComponentLink3Description: LCSC Part URL; ComponentLink3URL: https://lcsc.com/product-detail/Inductors-SMD_Sunlord-Sunlord-SDFL2012LR15KTF_C74320.html
footprint IND-0805 (0805 (2012M) Inductor)
pins: 1, 2

## SDFL2012LR18KTF
designator L?  Inductance: 180nH
Inductor, 180nH, ±10%, 400mΩ, 250mA, SMD 0805; Manufacturer: Sunlord; Manufacturer Part Number: SDFL2012LR18KTF; Package Size: 0805; JLCPCB Basic Part: No; JLCPCB Part Number: C95971; Supplier 1: LCSC; Category: Inductors; Supplier Part Number 1: C95971; Tolerance: ±10%; Rated Current: 250mA; DC Resistance: 400mΩ; RoHS: Yes; ComponentLink1Description: Datasheet; ComponentLink1URL: https://wmsc.lcsc.com/wmsc/upload/file/pdf/v2/lcsc/2310301641_Sunlord-SDFL2012LR18KTF_C95971.pdf; ComponentLink2Description: JLCPCB Part URL; ComponentLink2URL: https://jlcpcb.com/partdetail/C95971; ComponentLink3Description: LCSC Part URL; ComponentLink3URL: https://lcsc.com/product-detail/Inductors-SMD_Sunlord-Sunlord-SDFL2012LR18KTF_C95971.html
footprint IND-0805 (0805 (2012M) Inductor)
pins: 1, 2

## SDFL2012LR22KTF
designator L?  Inductance: 220nH
Inductor, 220nH, ±10%, 500mΩ, 250mA, SMD 0805; Manufacturer: Sunlord; Manufacturer Part Number: SDFL2012LR22KTF; Package Size: 0805; JLCPCB Basic Part: No; JLCPCB Part Number: C370270; Supplier 1: LCSC; Category: Inductors; Supplier Part Number 1: C370270; Tolerance: ±10%; Rated Current: 250mA; DC Resistance: 500mΩ; RoHS: Yes; ComponentLink1Description: Datasheet; ComponentLink1URL: https://wmsc.lcsc.com/wmsc/upload/file/pdf/v2/lcsc/2310301641_Sunlord-SDFL2012LR22KTF_C370270.pdf; ComponentLink2Description: JLCPCB Part URL; ComponentLink2URL: https://jlcpcb.com/partdetail/C370270; ComponentLink3Description: LCSC Part URL; ComponentLink3URL: https://lcsc.com/product-detail/Inductors-SMD_Sunlord-Sunlord-SDFL2012LR22KTF_C370270.html
footprint IND-0805 (0805 (2012M) Inductor)
pins: 1, 2

## SDFL2012LR27KTF
designator L?  Inductance: 270nH
Inductor, 270nH, ±10%, 500mΩ, 250mA, SMD 0805; Manufacturer: Sunlord; Manufacturer Part Number: SDFL2012LR27KTF; Package Size: 0805; JLCPCB Basic Part: No; JLCPCB Part Number: C316405; Supplier 1: LCSC; Category: Inductors; Supplier Part Number 1: C316405; Tolerance: ±10%; Rated Current: 250mA; DC Resistance: 500mΩ; RoHS: Yes; ComponentLink1Description: Datasheet; ComponentLink1URL: https://wmsc.lcsc.com/wmsc/upload/file/pdf/v2/lcsc/2310301641_Sunlord-SDFL2012LR27KTF_C316405.pdf; ComponentLink2Description: JLCPCB Part URL; ComponentLink2URL: https://jlcpcb.com/partdetail/C316405; ComponentLink3Description: LCSC Part URL; ComponentLink3URL: https://lcsc.com/product-detail/Inductors-SMD_Sunlord-Sunlord-SDFL2012LR27KTF_C316405.html
footprint IND-0805 (0805 (2012M) Inductor)
pins: 1, 2

## SDFL2012LR33KTF
designator L?  Inductance: 330nH
Inductor, 330nH, ±10%, 550mΩ, 250mA, SMD 0805; Manufacturer: Sunlord; Manufacturer Part Number: SDFL2012LR33KTF; Package Size: 0805; JLCPCB Basic Part: No; JLCPCB Part Number: C30617; Supplier 1: LCSC; Category: Inductors; Supplier Part Number 1: C30617; Tolerance: ±10%; Rated Current: 250mA; DC Resistance: 550mΩ; RoHS: Yes; ComponentLink1Description: Datasheet; ComponentLink1URL: https://wmsc.lcsc.com/wmsc/upload/file/pdf/v2/lcsc/2310301641_Sunlord-SDFL2012LR33KTF_C30617.pdf; ComponentLink2Description: JLCPCB Part URL; ComponentLink2URL: https://jlcpcb.com/partdetail/C30617; ComponentLink3Description: LCSC Part URL; ComponentLink3URL: https://lcsc.com/product-detail/Inductors-SMD_Sunlord-Sunlord-SDFL2012LR33KTF_C30617.html
footprint IND-0805 (0805 (2012M) Inductor)
pins: 1, 2

## SDFL2012LR39KTF
designator L?  Inductance: 390nH
Inductor, 390nH, ±10%, 650mΩ, 200mA, SMD 0805; Manufacturer: Sunlord; Manufacturer Part Number: SDFL2012LR39KTF; Package Size: 0805; JLCPCB Basic Part: No; JLCPCB Part Number: C316404; Supplier 1: LCSC; Category: Inductors; Supplier Part Number 1: C316404; Tolerance: ±10%; Rated Current: 200mA; DC Resistance: 650mΩ; RoHS: Yes; ComponentLink1Description: Datasheet; ComponentLink1URL: https://wmsc.lcsc.com/wmsc/upload/file/pdf/v2/lcsc/2310301641_Sunlord-SDFL2012LR39KTF_C316404.pdf; ComponentLink2Description: JLCPCB Part URL; ComponentLink2URL: https://jlcpcb.com/partdetail/C316404; ComponentLink3Description: LCSC Part URL; ComponentLink3URL: https://lcsc.com/product-detail/Inductors-SMD_Sunlord-Sunlord-SDFL2012LR39KTF_C316404.html
footprint IND-0805 (0805 (2012M) Inductor)
pins: 1, 2

## SDFL2012LR47KTF
designator L?  Inductance: 470nH
Inductor, 470nH, ±10%, 650mΩ, 200mA, SMD 0805; Manufacturer: Sunlord; Manufacturer Part Number: SDFL2012LR47KTF; Package Size: 0805; JLCPCB Basic Part: No; JLCPCB Part Number: C48556; Supplier 1: LCSC; Category: Inductors; Supplier Part Number 1: C48556; Tolerance: ±10%; Rated Current: 200mA; DC Resistance: 650mΩ; RoHS: Yes; ComponentLink1Description: Datasheet; ComponentLink1URL: https://wmsc.lcsc.com/wmsc/upload/file/pdf/v2/lcsc/2310301641_Sunlord-SDFL2012LR47KTF_C48556.pdf; ComponentLink2Description: JLCPCB Part URL; ComponentLink2URL: https://jlcpcb.com/partdetail/C48556; ComponentLink3Description: LCSC Part URL; ComponentLink3URL: https://lcsc.com/product-detail/Inductors-SMD_Sunlord-Sunlord-SDFL2012LR47KTF_C48556.html
footprint IND-0805 (0805 (2012M) Inductor)
pins: 1, 2

## SDFL2012LR56KTF
designator L?  Inductance: 560nH
Inductor, 560nH, ±10%, 750mΩ, 150mA, SMD 0805; Manufacturer: Sunlord; Manufacturer Part Number: SDFL2012LR56KTF; Package Size: 0805; JLCPCB Basic Part: No; JLCPCB Part Number: C19962; Supplier 1: LCSC; Category: Inductors; Supplier Part Number 1: C19962; Tolerance: ±10%; Rated Current: 150mA; DC Resistance: 750mΩ; RoHS: Yes; ComponentLink1Description: Datasheet; ComponentLink1URL: https://wmsc.lcsc.com/wmsc/upload/file/pdf/v2/lcsc/2310301641_Sunlord-SDFL2012LR56KTF_C19962.pdf; ComponentLink2Description: JLCPCB Part URL; ComponentLink2URL: https://jlcpcb.com/partdetail/C19962; ComponentLink3Description: LCSC Part URL; ComponentLink3URL: https://lcsc.com/product-detail/Inductors-SMD_Sunlord-Sunlord-SDFL2012LR56KTF_C19962.html
footprint IND-0805 (0805 (2012M) Inductor)
pins: 1, 2

## SDFL2012LR68KTF
designator L?  Inductance: 680nH
Inductor, 680nH, ±10%, 800mΩ, 150mA, SMD 0805; Manufacturer: Sunlord; Manufacturer Part Number: SDFL2012LR68KTF; Package Size: 0805; JLCPCB Basic Part: No; JLCPCB Part Number: C74315; Supplier 1: LCSC; Category: Inductors; Supplier Part Number 1: C74315; Tolerance: ±10%; Rated Current: 150mA; DC Resistance: 800mΩ; RoHS: Yes; ComponentLink1Description: Datasheet; ComponentLink1URL: https://wmsc.lcsc.com/wmsc/upload/file/pdf/v2/lcsc/2310301641_Sunlord-SDFL2012LR68KTF_C74315.pdf; ComponentLink2Description: JLCPCB Part URL; ComponentLink2URL: https://jlcpcb.com/partdetail/C74315; ComponentLink3Description: LCSC Part URL; ComponentLink3URL: https://lcsc.com/product-detail/Inductors-SMD_Sunlord-Sunlord-SDFL2012LR68KTF_C74315.html
footprint IND-0805 (0805 (2012M) Inductor)
pins: 1, 2

## SDFL2012LR82KTF
designator L?  Inductance: 820nH
Inductor, 820nH, ±10%, 1Ω, 150mA, SMD 0805; Manufacturer: Sunlord; Manufacturer Part Number: SDFL2012LR82KTF; Package Size: 0805; JLCPCB Basic Part: No; JLCPCB Part Number: C74316; Supplier 1: LCSC; Category: Inductors; Supplier Part Number 1: C74316; Tolerance: ±10%; Rated Current: 150mA; DC Resistance: 1Ω; RoHS: Yes; ComponentLink1Description: Datasheet; ComponentLink1URL: https://wmsc.lcsc.com/wmsc/upload/file/pdf/v2/lcsc/2310301641_Sunlord-SDFL2012LR82KTF_C74316.pdf; ComponentLink2Description: JLCPCB Part URL; ComponentLink2URL: https://jlcpcb.com/partdetail/C74316; ComponentLink3Description: LCSC Part URL; ComponentLink3URL: https://lcsc.com/product-detail/Inductors-SMD_Sunlord-Sunlord-SDFL2012LR82KTF_C74316.html
footprint IND-0805 (0805 (2012M) Inductor)
pins: 1, 2

## SDFL2012P1R0KTF
designator L?  Inductance: 1uH
Inductor, 1uH, ±10%, 400mΩ, 50mA, SMD 0805; Manufacturer: Sunlord; Manufacturer Part Number: SDFL2012P1R0KTF; Package Size: 0805; JLCPCB Basic Part: No; JLCPCB Part Number: C370271; Supplier 1: LCSC; Category: Inductors; Supplier Part Number 1: C370271; Tolerance: ±10%; Rated Current: 50mA; DC Resistance: 400mΩ; RoHS: Yes; ComponentLink1Description: Datasheet; ComponentLink1URL: https://wmsc.lcsc.com/wmsc/upload/file/pdf/v2/lcsc/2310301641_Sunlord-SDFL2012P1R0KTF_C370271.pdf; ComponentLink2Description: JLCPCB Part URL; ComponentLink2URL: https://jlcpcb.com/partdetail/C370271; ComponentLink3Description: LCSC Part URL; ComponentLink3URL: https://lcsc.com/product-detail/Inductors-SMD_Sunlord-Sunlord-SDFL2012P1R0KTF_C370271.html
footprint IND-0805 (0805 (2012M) Inductor)
pins: 1, 2

## SDFL2012Q1R0KTF
designator L?  Inductance: 1uH
Inductor, 1uH, ±10%, 400mΩ, 50mA, SMD 0805; Manufacturer: Sunlord; Manufacturer Part Number: SDFL2012Q1R0KTF; Package Size: 0805; JLCPCB Basic Part: No; JLCPCB Part Number: C1042; Supplier 1: LCSC; Category: Inductors; Supplier Part Number 1: C1042; Tolerance: ±10%; Rated Current: 50mA; DC Resistance: 400mΩ; RoHS: Yes; ComponentLink1Description: Datasheet; ComponentLink1URL: https://wmsc.lcsc.com/wmsc/upload/file/pdf/v2/lcsc/2310301641_Sunlord-SDFL2012Q1R0KTF_C1042.pdf; ComponentLink2Description: JLCPCB Part URL; ComponentLink2URL: https://jlcpcb.com/partdetail/C1042; ComponentLink3Description: LCSC Part URL; ComponentLink3URL: https://lcsc.com/product-detail/Inductors-SMD_Sunlord-Sunlord-SDFL2012Q1R0KTF_C1042.html
footprint IND-0805 (0805 (2012M) Inductor)
pins: 1, 2

## SDFL2012Q1R2KTF
designator L?  Inductance: 1.2uH
Inductor, 1.2uH, ±10%, 500mΩ, 50mA, SMD 0805; Manufacturer: Sunlord; Manufacturer Part Number: SDFL2012Q1R2KTF; Package Size: 0805; JLCPCB Basic Part: No; JLCPCB Part Number: C74322; Supplier 1: LCSC; Category: Inductors; Supplier Part Number 1: C74322; Tolerance: ±10%; Rated Current: 50mA; DC Resistance: 500mΩ; RoHS: Yes; ComponentLink1Description: Datasheet; ComponentLink1URL: https://wmsc.lcsc.com/wmsc/upload/file/pdf/v2/lcsc/2310301641_Sunlord-SDFL2012Q1R2KTF_C74322.pdf; ComponentLink2Description: JLCPCB Part URL; ComponentLink2URL: https://jlcpcb.com/partdetail/C74322; ComponentLink3Description: LCSC Part URL; ComponentLink3URL: https://lcsc.com/product-detail/Inductors-SMD_Sunlord-Sunlord-SDFL2012Q1R2KTF_C74322.html
footprint IND-0805 (0805 (2012M) Inductor)
pins: 1, 2

## SDFL2012Q1R5KTF
designator L?  Inductance: 1.5uH
Inductor, 1.5uH, ±10%, 500mΩ, 50mA, SMD 0805; Manufacturer: Sunlord; Manufacturer Part Number: SDFL2012Q1R5KTF; Package Size: 0805; JLCPCB Basic Part: No; JLCPCB Part Number: C316402; Supplier 1: LCSC; Category: Inductors; Supplier Part Number 1: C316402; Tolerance: ±10%; Rated Current: 50mA; DC Resistance: 500mΩ; RoHS: Yes; ComponentLink1Description: Datasheet; ComponentLink1URL: https://wmsc.lcsc.com/wmsc/upload/file/pdf/v2/lcsc/2310301641_Sunlord-SDFL2012Q1R5KTF_C316402.pdf; ComponentLink2Description: JLCPCB Part URL; ComponentLink2URL: https://jlcpcb.com/partdetail/C316402; ComponentLink3Description: LCSC Part URL; ComponentLink3URL: https://lcsc.com/product-detail/Inductors-SMD_Sunlord-Sunlord-SDFL2012Q1R5KTF_C316402.html
footprint IND-0805 (0805 (2012M) Inductor)
pins: 1, 2

## SDFL2012Q1R8KTF
designator L?  Inductance: 1.8uH
Inductor, 1.8uH, ±10%, 600mΩ, 50mA, SMD 0805; Manufacturer: Sunlord; Manufacturer Part Number: SDFL2012Q1R8KTF; Package Size: 0805; JLCPCB Basic Part: No; JLCPCB Part Number: C95972; Supplier 1: LCSC; Category: Inductors; Supplier Part Number 1: C95972; Tolerance: ±10%; Rated Current: 50mA; DC Resistance: 600mΩ; RoHS: Yes; ComponentLink1Description: Datasheet; ComponentLink1URL: https://wmsc.lcsc.com/wmsc/upload/file/pdf/v2/lcsc/2310301641_Sunlord-SDFL2012Q1R8KTF_C95972.pdf; ComponentLink2Description: JLCPCB Part URL; ComponentLink2URL: https://jlcpcb.com/partdetail/C95972; ComponentLink3Description: LCSC Part URL; ComponentLink3URL: https://lcsc.com/product-detail/Inductors-SMD_Sunlord-Sunlord-SDFL2012Q1R8KTF_C95972.html
footprint IND-0805 (0805 (2012M) Inductor)
pins: 1, 2